# Altium footprint library Connectors Pad Lib.PcbLib: 211 footprints (part 14 of 14)
Each footprint in its own frame and in the unit in brackets; x right, y up, seen from the top. Pads: shape width x height; smd on the part's side, far side on the other; paste and mask are expansions set on the pad; w line width, h text height; cw(c..) or ccw(c..) is an arc to the next point about the centre after c.
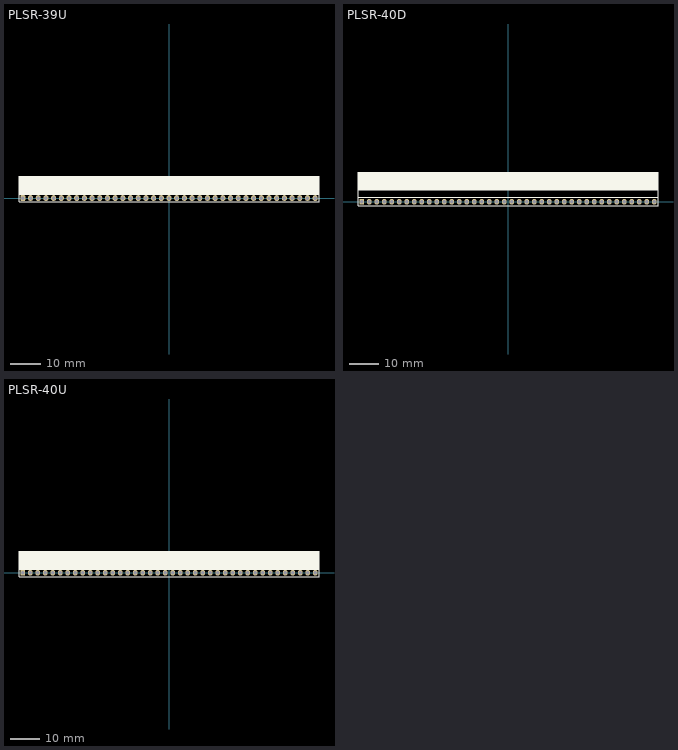
[diagram p13: the footprints below, top view; thin cyan lines are the x and y axes]

## PLSR-39U [mil] "PCB Right Angled Single Connector (U Type) 39-Pin"
height 236.3
pads (39):
  rrect50% 65x75 hole 45: 1(-1900,0)
  oval 65x75 hole 45: 2(-1800,0) 3(-1700,0) 4(-1600,0) 5(-1500,0) 6(-1400,0) 7(-1300,0) 8(-1200,0) 9(-1100,0) 10(-1000,0) 11(-900,0) 12(-800,0) 13(-700,0) 14(-600,0) 15(-500,0) 16(-400,0) 17(-300,0) 18(-200,0) 19(-100,0) 20(0,0) 21(100,0) 22(200,0) 23(300,0) 24(400,0) 25(500,0) 26(600,0) 27(700,0) 28(800,0) 29(900,0) 30(1000,0) 31(1100,0) 32(1200,0) 33(1300,0) 34(1400,0) 35(1500,0) 36(1600,0) 37(1700,0) 38(1800,0) 39(1900,0)
Top Overlay:
  rectangle: -1950,50 1950,285
  lines w10: -1950,50 1950,50 ; -1950,-50 -1950,285 1950,285 1950,-50 -1950,-50
3D body "PLSRU-39.STEP": height 239.98, standoff -117.11, extent -1950,-50 1950,286.22

## PLSR-40D [mil] "PCB Right Angled Single Connector (D Type) 40-Pin"
height 98.42
pads (40):
  rrect50% 65x75 hole 45: 1(-1950,0)
  oval 65x75 hole 45: 2(-1850,0) 3(-1750,0) 4(-1650,0) 5(-1550,0) 6(-1450,0) 7(-1350,0) 8(-1250,0) 9(-1150,0) 10(-1050,0) 11(-950,0) 12(-850,0) 13(-750,0) 14(-650,0) 15(-550,0) 16(-450,0) 17(-350,0) 18(-250,0) 19(-150,0) 20(-50,0) 21(50,0) 22(150,0) 23(250,0) 24(350,0) 25(450,0) 26(550,0) 27(650,0) 28(750,0) 29(850,0) 30(950,0) 31(1050,0) 32(1150,0) 33(1250,0) 34(1350,0) 35(1450,0) 36(1550,0) 37(1650,0) 38(1750,0) 39(1850,0) 40(1950,0)
Top Overlay:
  rectangle: -2000,160 2000,395
  lines w10: -2000,61 2000,61 ; -2000,161 2000,161 ; -2000,-55 2000,-55 2000,395 -2000,395 -2000,-55
3D body "PLSR-40D.STEP": height 101, standoff -117.11, extent -2000,-11.02 2000,396.85

## PLSR-40U [mil] "PCB Right Angled Single Connector (U Type) 40-Pin"
height 236.3
pads (40):
  rrect50% 65x75 hole 45: 1(-1950,0)
  oval 65x75 hole 45: 2(-1850,0) 3(-1750,0) 4(-1650,0) 5(-1550,0) 6(-1450,0) 7(-1350,0) 8(-1250,0) 9(-1150,0) 10(-1050,0) 11(-950,0) 12(-850,0) 13(-750,0) 14(-650,0) 15(-550,0) 16(-450,0) 17(-350,0) 18(-250,0) 19(-150,0) 20(-50,0) 21(50,0) 22(150,0) 23(250,0) 24(350,0) 25(450,0) 26(550,0) 27(650,0) 28(750,0) 29(850,0) 30(950,0) 31(1050,0) 32(1150,0) 33(1250,0) 34(1350,0) 35(1450,0) 36(1550,0) 37(1650,0) 38(1750,0) 39(1850,0) 40(1950,0)
Top Overlay:
  rectangle: -2000,50 2000,285
  lines w10: -2000,50 2000,50 ; -2000,-50 2000,-50 2000,285 -2000,285 -2000,-50
3D body "PLSRU-40.STEP": height 239.98, standoff -117.11, extent -2000,-50 2000,286.22